# Altium footprint library Connector.PcbLib: 230 footprints (part 1 of 15)
Each footprint in its own frame and in the unit in brackets; x right, y up, seen from the top. Pads: shape width x height; smd on the part's side, far side on the other; paste and mask are expansions set on the pad; w line width, h text height; cw(c..) or ccw(c..) is an arc to the next point about the centre after c.
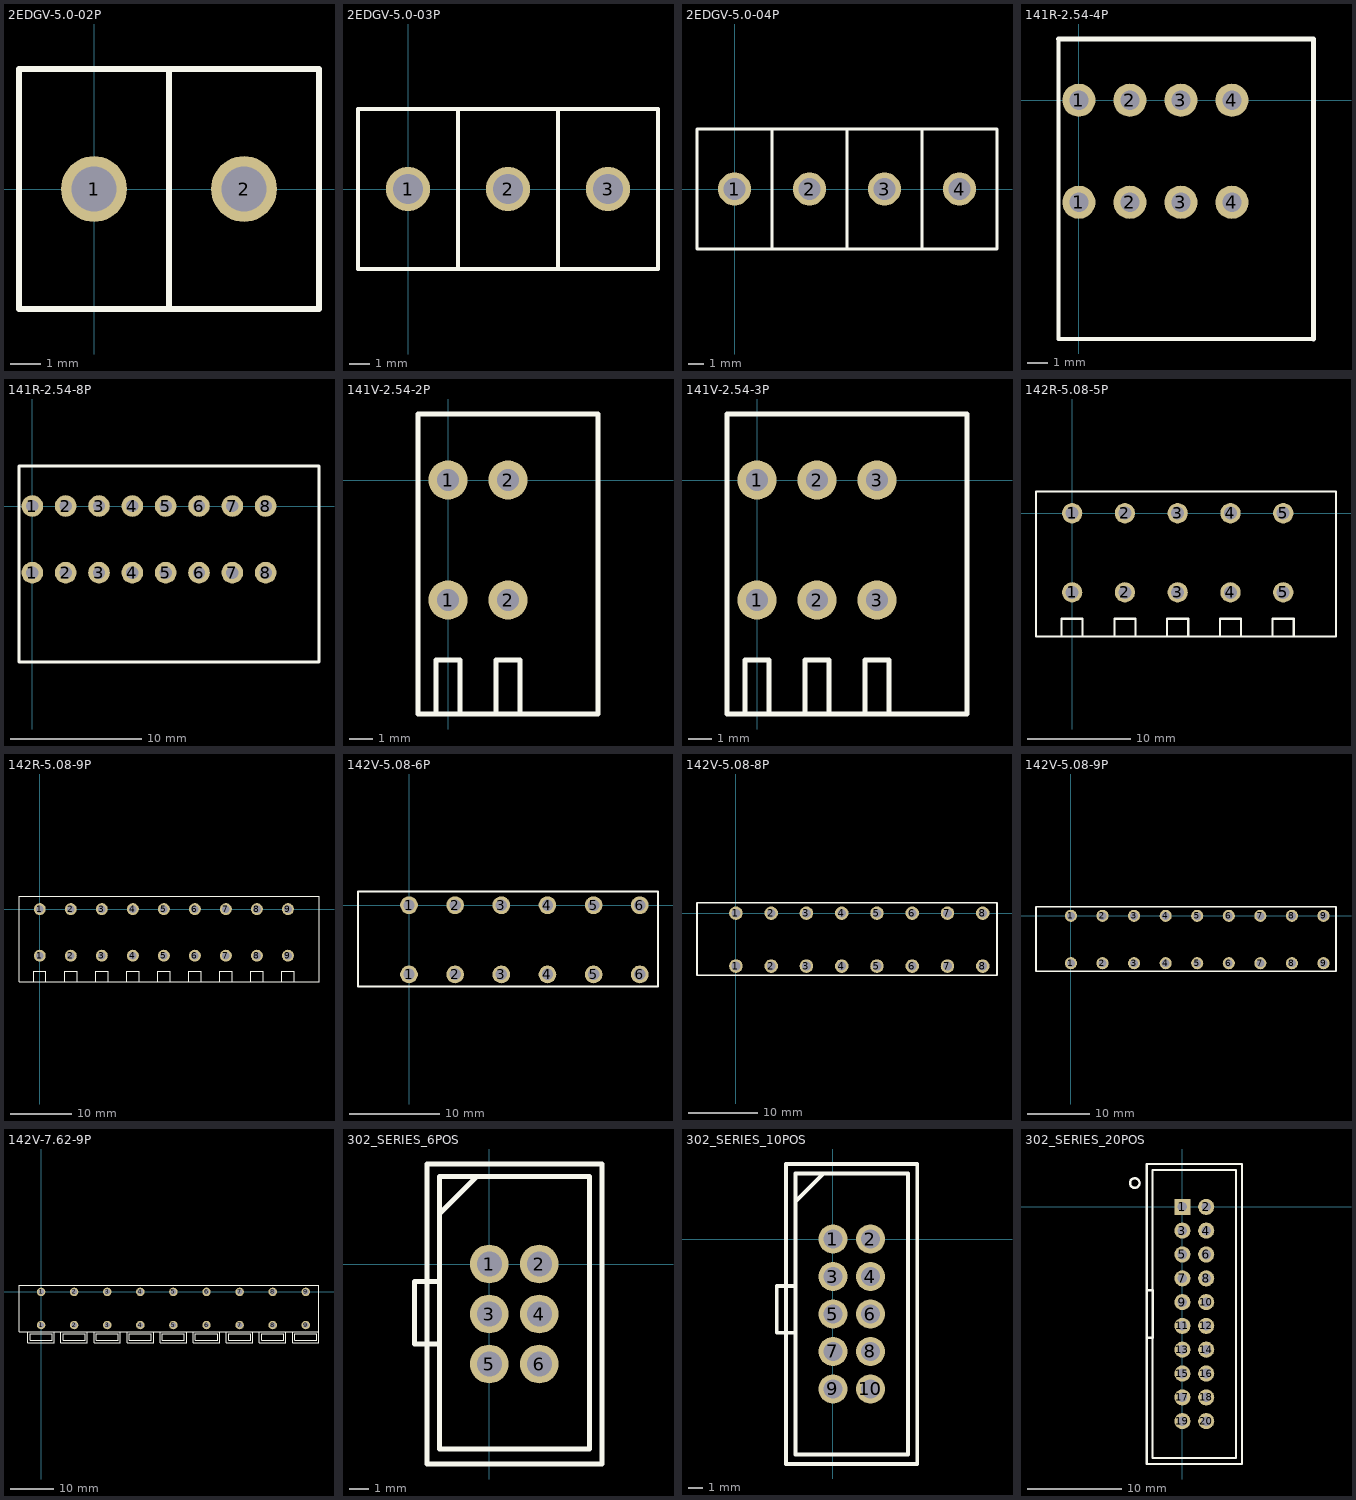
[diagram p0: the footprints below, top view; thin cyan lines are the x and y axes]

## 2EDGV-5.0-02P [mm]
pads (2):
  round 2.2 hole 1.5: 1(0,0) 2(5,0)
Top Overlay:
  lines w0.2: 2.5,-4 2.5,4 ; -2.5,-4 7.5,-4 7.5,4 -2.5,4 -2.5,0 -2.5,-4
3D body: height 12, standoff 0, extent 4.572,-0.508 5.5,0.508
3D body: height 12, standoff 0, extent -0.508,-0.508 0.508,0.508
3D body: height 12, standoff 0, extent -2.54,-4 7.46,-3.302
3D body: height 12, standoff 0, extent -2.5,3.302 7.5,4
3D body: height 2, standoff 0, extent -2.5,-4 7.5,4

## 2EDGV-5.0-03P [mm]
pads (3):
  round 2.2 hole 1.5: 1(0,0) 2(5,0) 3(10,0)
Top Overlay:
  lines w0.2: 2.5,-4 2.5,4 ; 7.5,-4 12.5,-4 12.5,4 7.5,4 ; 7.5,-4 -2.5,-4 -2.5,0 -2.5,4 7.5,4 ; 7.5,-4 7.5,4
3D body: height 12, standoff 0, extent 7.5,-4 12.5,4
3D body: height 12, standoff 0, extent -2.5,-4 7.5,4

## 2EDGV-5.0-04P [mm]
pads (4):
  round 2.2 hole 1.5: 1(0,0) 2(5,0) 3(10,0) 4(15,0)
Top Overlay:
  lines w0.2: 2.5,-4 2.5,4 ; 12.5,-4 12.5,4 ; 7.5,-4 7.5,4 ; 7.5,-4 -2.5,-4 -2.5,0 -2.5,4 7.5,4 ; 7.5,-4 17.5,-4 17.5,4 7.5,4
3D body: height 12, standoff 0, extent -2.5,-4 7.5,4
3D body: height 12, standoff 0, extent 7.5,-4 17.5,4

## 141R-2.54-4P [mm] "TERM BLOCK 8POS 90DEG 2.54MM PCB"
height 14.1
pads (8):
  round 1.65 hole 0.95: 1(0,-5.08) 1(0,0) 2(2.54,-5.08) 2(2.54,0) 3(5.08,-5.08) 3(5.08,0) 4(7.62,-5.08) 4(7.62,0)
Top Overlay:
  lines w0.2: -1.016,-10.16 -1.016,-11.887 ; 11.684,-11.887 -1.016,-11.887 ; 11.684,3.048 0.94,3.048 -1.016,3.048 -1.016,1.233 -1.016,-7.818 -1.016,-11.887
  lines w0.254: -1.016,3.048 11.684,3.048 11.684,-11.887

## 141R-2.54-8P [mm] "TERM BLOCK 8POS 90DEG 2.54MM PCB"
height 14.1
pads (16):
  round 1.65 hole 0.95: 1(0,-5.08) 1(0,0) 2(2.54,-5.08) 2(2.54,0) 3(5.08,-5.08) 3(5.08,0) 4(7.62,-5.08) 4(7.62,0) 5(10.16,-5.08) 5(10.16,0) 6(12.7,-5.08) 6(12.7,0) 7(15.24,-5.08) 7(15.24,0) 8(17.78,-5.08) 8(17.78,0)
Top Overlay:
  lines w0.2: -1.016,-10.16 -1.016,-11.887 ; 21.844,-11.887 -1.016,-11.887 ; 21.844,3.048 0.94,3.048 -1.016,3.048 -1.016,1.233 -1.016,-7.818 -1.016,-11.887
  lines w0.254: -1.016,3.048 21.844,3.048 21.844,-11.887

## 141V-2.54-2P [mm]
height 13.6
pads (4):
  round 1.65 hole 0.95: 1(0,-5.08) 1(0,0) 2(2.54,-5.08) 2(2.54,0)
Top Overlay:
  lines w0.2: -0.508,-9.906 -0.508,-7.62 0.508,-7.62 0.508,-9.906 ; 2.032,-9.906 2.032,-7.62 3.048,-7.62 3.048,-9.906 ; -1.27,-9.906 -1.27,-1.307 -1.27,2.794 6.35,2.794 6.35,-9.906 -1.27,-9.906
3D body: height 13.6, standoff 0, extent -1.27,-8.89 6.35,2.794
3D body: height 13.6, standoff 6, extent -0.508,-9.906 0.508,-7.62
3D body: height 13.6, standoff 6, extent 2.032,-9.906 3.048,-7.62

## 141V-2.54-3P [mm]
height 13.6
pads (6):
  round 1.65 hole 0.95: 1(0,-5.08) 1(0,0) 2(2.54,-5.08) 2(2.54,0) 3(5.08,-5.08) 3(5.08,0)
Top Overlay:
  lines w0.2: -0.508,-9.906 -0.508,-7.62 0.508,-7.62 0.508,-9.906 ; 2.032,-9.906 2.032,-7.62 3.048,-7.62 3.048,-9.906 ; 4.572,-9.906 4.572,-7.62 5.588,-7.62 5.588,-9.906 ; -1.27,-9.906 -1.27,-1.307 -1.27,2.794 8.89,2.794 8.89,-9.906 -1.27,-9.906
3D body: height 13.6, standoff 0, extent -1.27,-8.382 8.89,2.794
3D body: height 13.6, standoff 6, extent -0.508,-9.906 0.508,-7.62
3D body: height 13.6, standoff 6, extent 2.032,-9.906 3.048,-7.62
3D body: height 13.6, standoff 6, extent 4.572,-9.906 5.588,-7.62

## 142R-5.08-5P [mm] "TERM BLOCK 5POS 90DEG 5.08MM PCB"
height 14.1
pads (10):
  round 1.95 hole 1.25: 1(0,-7.62) 1(0,0) 2(5.08,-7.62) 2(5.08,0) 3(10.16,-7.62) 3(10.16,0) 4(15.24,-7.62) 4(15.24,0) 5(20.32,-7.62) 5(20.32,0)
Top Overlay:
  lines w0.2: -1.016,-11.887 -1.016,-10.16 1.016,-10.16 1.016,-11.887 ; 4.064,-11.887 4.064,-10.16 6.096,-10.16 6.096,-11.887 ; 9.144,-11.887 9.144,-10.16 11.176,-10.16 11.176,-11.887 ; 14.224,-11.887 14.224,-10.16 16.256,-10.16 16.256,-11.887 ; 19.304,-11.887 19.304,-10.16 21.336,-10.16 21.336,-11.887 ; 25.4,-9.144 25.4,1.524 25.4,2.108 ; 25.4,2.108 -3.48,2.108 -3.48,1.524 -3.48,-7.62 -3.48,-9.144 -3.48,-11.887 21.92,-11.887 25.4,-11.887 25.4,2.108

## 142R-5.08-9P [mm] "TERM BLOCK 9POS 90DEG 5.08MM PCB"
height 14.1
pads (18):
  round 1.95 hole 1.25: 1(0,-7.62) 1(0,0) 2(5.08,-7.62) 2(5.08,0) 3(10.16,-7.62) 3(10.16,0) 4(15.24,-7.62) 4(15.24,0) 5(20.32,-7.62) 5(20.32,0) 6(25.4,-7.62) 6(25.4,0) 7(30.48,-7.62) 7(30.48,0) 8(35.56,-7.62) 8(35.56,0) 9(40.64,-7.62) 9(40.64,0)
Top Overlay:
  lines w0.2: -1.016,-11.887 -1.016,-10.16 1.016,-10.16 1.016,-11.887 ; 4.064,-11.887 4.064,-10.16 6.096,-10.16 6.096,-11.887 ; 9.144,-11.887 9.144,-10.16 11.176,-10.16 11.176,-11.887 ; 14.224,-11.887 14.224,-10.16 16.256,-10.16 16.256,-11.887 ; 19.304,-11.887 19.304,-10.16 21.336,-10.16 21.336,-11.887 ; 19.64,0 20.32,-0.68 ; 24.384,-11.887 24.384,-10.16 26.416,-10.16 26.416,-11.887 ; 29.464,-11.887 29.464,-10.16 31.496,-10.16 31.496,-11.887 ; 34.544,-11.887 34.544,-10.16 36.576,-10.16 36.576,-11.887 ; 39.624,-11.887 39.624,-10.16 41.656,-10.16 41.656,-11.887 ; 45.72,-9.144 45.72,1.524 45.72,2.108 ; 45.72,2.108 45.72,-11.887 42.24,-11.887 -3.404,-11.887 -3.404,-9.144 -3.404,-7.62 -3.404,1.524 -3.404,2.108 -3.378,2.108 0,2.108 45.72,2.108

## 142V-5.08-6P [mm] "TERM BLOCK 6POS VERTICAL 5.08MM PCB"
height 14.1
pads (12):
  round 1.95 hole 1.25: 1(0,-7.62) 1(0,0) 2(5.08,-7.62) 2(5.08,0) 3(10.16,-7.62) 3(10.16,0) 4(15.24,-7.62) 4(15.24,0) 5(20.32,-7.62) 5(20.32,0) 6(25.4,-7.62) 6(25.4,0)
Top Overlay:
  lines w0.254: -5.613,-8.941 27.407,-8.941 27.407,1.473 27.381,1.499 -5.613,1.499 -5.613,-8.941
3D body: height 14.1, standoff 0, extent -5.588,-8.941 27.407,1.499
3D body: height 9, standoff 2, extent -2.54,-11.938 -1.524,-8.89
3D body: height 14.1, standoff 8, extent -2.54,-11.938 2.032,-8.89
3D body: height 14.2, standoff 14.1, extent -1.494,-7.847 1.494,-4.853
3D body: height 9, standoff 2, extent 2.54,-11.938 3.556,-8.89
3D body: height 14.1, standoff 8, extent 2.54,-11.938 7.112,-8.89
3D body: height 14.2, standoff 14.1, extent 3.586,-7.847 6.574,-4.853
3D body: height 9, standoff 2, extent 7.62,-11.938 8.636,-8.89
3D body: height 14.1, standoff 8, extent 7.62,-11.938 12.192,-8.89
3D body: height 14.2, standoff 14.1, extent 8.666,-7.847 11.654,-4.853
3D body: height 9, standoff 2, extent 12.7,-11.938 13.716,-8.89
3D body: height 14.1, standoff 8, extent 12.7,-11.938 17.272,-8.89
3D body: height 14.2, standoff 14.1, extent 13.746,-7.847 16.734,-4.853
3D body: height 9, standoff 2, extent 17.78,-11.938 18.796,-8.89
3D body: height 14.1, standoff 8, extent 17.78,-11.938 22.352,-8.89
3D body: height 14.2, standoff 14.1, extent 18.826,-7.847 21.814,-4.853
3D body: height 9, standoff 2, extent 22.86,-11.938 23.876,-8.89
3D body: height 14.1, standoff 8, extent 22.86,-11.938 27.432,-8.89
3D body: height 14.2, standoff 14.1, extent 23.906,-7.847 26.894,-4.853

## 142V-5.08-8P [mm] "TERM BLOCK 8POS VERTICAL 5.08MM PCB"
height 14.1
pads (16):
  round 1.95 hole 1.25: 1(0,-7.62) 1(0,0) 2(5.08,-7.62) 2(5.08,0) 3(10.16,-7.62) 3(10.16,0) 4(15.24,-7.62) 4(15.24,0) 5(20.32,-7.62) 5(20.32,0) 6(25.4,-7.62) 6(25.4,0) 7(30.48,-7.62) 7(30.48,0) 8(35.56,-7.62) 8(35.56,0)
Top Overlay:
  lines w0.254: -5.613,-8.941 -5.613,1.499 37.617,1.499 37.617,-3.505 37.617,-8.941 -5.613,-8.941
3D body: height 14.2, standoff 14.1, extent 23.906,-7.847 26.894,-4.853
3D body: height 14.1, standoff 8, extent 22.86,-11.938 27.432,-8.89
3D body: height 9, standoff 2, extent 22.86,-11.938 23.876,-8.89
3D body: height 14.2, standoff 14.1, extent 18.826,-7.847 21.814,-4.853
3D body: height 14.1, standoff 8, extent 17.78,-11.938 22.352,-8.89
3D body: height 9, standoff 2, extent 17.78,-11.938 18.796,-8.89
3D body: height 14.2, standoff 14.1, extent 13.746,-7.847 16.734,-4.853
3D body: height 14.1, standoff 8, extent 12.7,-11.938 17.272,-8.89
3D body: height 9, standoff 2, extent 12.7,-11.938 13.716,-8.89
3D body: height 14.2, standoff 14.1, extent 8.666,-7.847 11.654,-4.853
3D body: height 14.1, standoff 8, extent 7.62,-11.938 12.192,-8.89
3D body: height 9, standoff 2, extent 7.62,-11.938 8.636,-8.89
3D body: height 14.2, standoff 14.1, extent 3.586,-7.847 6.574,-4.853
3D body: height 14.1, standoff 8, extent 2.54,-11.938 7.112,-8.89
3D body: height 9, standoff 2, extent 2.54,-11.938 3.556,-8.89
3D body: height 14.2, standoff 14.1, extent -1.494,-7.847 1.494,-4.853
3D body: height 14.1, standoff 8, extent -2.54,-11.938 2.032,-8.89
3D body: height 9, standoff 2, extent -2.54,-11.938 -1.524,-8.89
3D body: height 14.1, standoff 0, extent -5.588,-8.941 37.592,1.499
3D body: height 14.2, standoff 14.1, extent 28.986,-7.847 31.974,-4.853
3D body: height 14.1, standoff 8, extent 27.94,-11.938 32.512,-8.89
3D body: height 9, standoff 2, extent 27.94,-11.938 28.956,-8.89
3D body: height 14.2, standoff 14.1, extent 34.066,-7.847 37.054,-4.853
3D body: height 14.1, standoff 8, extent 33.02,-11.938 37.592,-8.89
3D body: height 9, standoff 2, extent 33.02,-11.938 34.036,-8.89

## 142V-5.08-9P [mm] "TERM BLOCK 9POS VERTICAL 5.08MM PCB"
height 14.1
pads (18):
  round 1.95 hole 1.25: 1(0,-7.62) 1(0,0) 2(5.08,-7.62) 2(5.08,0) 3(10.16,-7.62) 3(10.16,0) 4(15.24,-7.62) 4(15.24,0) 5(20.32,-7.62) 5(20.32,0) 6(25.4,-7.62) 6(25.4,0) 7(30.48,-7.62) 7(30.48,0) 8(35.56,-7.62) 8(35.56,0) 9(40.64,-7.62) 9(40.64,0)
Top Overlay:
  lines w0.254: 42.621,1.499 42.647,1.473 42.647,-8.941 -5.613,-8.941 -5.613,1.499 42.647,1.499
3D body: height 9, standoff 2, extent 38.1,-11.938 39.116,-8.89
3D body: height 14.1, standoff 8, extent 38.1,-11.938 42.672,-8.89
3D body: height 14.2, standoff 14.1, extent 39.146,-7.847 42.134,-4.853
3D body: height 9, standoff 2, extent 33.02,-11.938 34.036,-8.89
3D body: height 14.1, standoff 8, extent 33.02,-11.938 37.592,-8.89
3D body: height 14.2, standoff 14.1, extent 34.066,-7.847 37.054,-4.853
3D body: height 9, standoff 2, extent 27.94,-11.938 28.956,-8.89
3D body: height 14.1, standoff 8, extent 27.94,-11.938 32.512,-8.89
3D body: height 14.2, standoff 14.1, extent 28.986,-7.847 31.974,-4.853
3D body: height 14.1, standoff 0, extent -5.588,-8.941 42.672,1.499
3D body: height 9, standoff 2, extent -2.54,-11.938 -1.524,-8.89
3D body: height 14.1, standoff 8, extent -2.54,-11.938 2.032,-8.89
3D body: height 14.2, standoff 14.1, extent -1.494,-7.847 1.494,-4.853
3D body: height 9, standoff 2, extent 2.54,-11.938 3.556,-8.89
3D body: height 14.1, standoff 8, extent 2.54,-11.938 7.112,-8.89
3D body: height 14.2, standoff 14.1, extent 3.586,-7.847 6.574,-4.853
3D body: height 9, standoff 2, extent 7.62,-11.938 8.636,-8.89
3D body: height 14.1, standoff 8, extent 7.62,-11.938 12.192,-8.89
3D body: height 14.2, standoff 14.1, extent 8.666,-7.847 11.654,-4.853
3D body: height 9, standoff 2, extent 12.7,-11.938 13.716,-8.89
3D body: height 14.1, standoff 8, extent 12.7,-11.938 17.272,-8.89
3D body: height 14.2, standoff 14.1, extent 13.746,-7.847 16.734,-4.853
3D body: height 9, standoff 2, extent 17.78,-11.938 18.796,-8.89
3D body: height 14.1, standoff 8, extent 17.78,-11.938 22.352,-8.89
3D body: height 14.2, standoff 14.1, extent 18.826,-7.847 21.814,-4.853
3D body: height 9, standoff 2, extent 22.86,-11.938 23.876,-8.89
3D body: height 14.1, standoff 8, extent 22.86,-11.938 27.432,-8.89
3D body: height 14.2, standoff 14.1, extent 23.906,-7.847 26.894,-4.853

## 142V-7.62-9P [mm] "TERM BLOCK 9POS 90DEG 7.62MM PCB"
height 14.1
pads (18):
  round 1.95 hole 1.25: 1(0,-7.62) 1(0,0) 2(7.62,-7.62) 2(7.62,0) 3(15.24,-7.62) 3(15.24,0) 4(22.86,-7.62) 4(22.86,0) 5(30.48,-7.62) 5(30.48,0) 6(38.1,-7.62) 6(38.1,0) 7(45.72,-7.62) 7(45.72,0) 8(53.34,-7.62) 8(53.34,0) 9(60.96,-7.62) 9(60.96,0)
Top Overlay:
  lines w0.2: -2.54,1.524 63.5,1.524 ; 3.048,-9.144 3.048,-11.684 -3.048,-11.684 -3.048,-9.144 ; 4.572,-9.144 4.572,-11.684 10.668,-11.684 10.668,-9.144 ; 12.192,-9.144 12.192,-11.684 18.288,-11.684 18.288,-9.144 ; 19.812,-9.144 19.812,-11.684 25.908,-11.684 25.908,-9.144 ; 27.432,-9.144 27.432,-11.684 33.528,-11.684 33.528,-9.144 ; 29.8,-7.62 30.48,-8.3 ; 29.8,0 30.48,-0.68 ; 35.052,-9.144 35.052,-11.684 41.148,-11.684 41.148,-9.144 ; 42.672,-9.144 42.672,-11.684 48.768,-11.684 48.768,-9.144 ; 50.292,-9.144 50.292,-11.684 56.388,-11.684 56.388,-9.144 ; 57.912,-9.144 57.912,-11.684 64.008,-11.684 64.008,-9.144 ; -3.048,-9.144 64.008,-9.144 ; -3.048,-9.144 -5.08,-9.144 -5.08,1.524 64.008,1.524 64.008,-9.144 ; -2.54,-11.176 2.54,-11.176 2.54,-9.652 -2.54,-9.652 -2.54,-11.176 ; 5.08,-11.176 5.08,-9.652 10.16,-9.652 10.16,-11.176 5.08,-11.176 ; 12.7,-11.176 12.7,-9.652 17.78,-9.652 17.78,-11.176 12.7,-11.176 ; 20.32,-11.176 20.32,-9.652 25.4,-9.652 25.4,-11.176 20.32,-11.176 ; 27.94,-11.176 27.94,-9.652 33.02,-9.652 33.02,-11.176 27.94,-11.176 ; 35.56,-11.176 35.56,-9.652 40.64,-9.652 40.64,-11.176 35.56,-11.176 ; 43.18,-11.176 43.18,-9.652 48.26,-9.652 48.26,-11.176 43.18,-11.176 ; 50.8,-11.176 50.8,-9.652 55.88,-9.652 55.88,-11.176 50.8,-11.176 ; 58.42,-11.176 58.42,-9.652 63.5,-9.652 63.5,-11.176 58.42,-11.176

## 302_SERIES_6POS [mm] "2.54MM DUAL ROW VERTICAL BOX HEADER"
pads (6):
  round 1.97 hole 1.27: 1(0,0) 2(2.54,0) 3(0,-2.54) 4(2.54,-2.54) 5(0,-5.08) 6(2.54,-5.08)
Top Overlay:
  lines w0.254: -2.54,-4.064 -3.175,-4.064 -3.81,-4.064 -3.81,-0.889 -3.175,-0.889 -2.54,-0.889 ; -2.54,2.54 -0.635,4.445 ; -3.175,-10.16 5.715,-10.16 5.715,5.08 -3.175,5.08 -3.175,-10.16 ; -2.54,-9.398 5.08,-9.398 5.08,4.445 -2.54,4.445 -2.54,-3.81 -2.54,-9.398

## 302_SERIES_10POS [mm] "2.54MM DUAL ROW VERTICAL BOX HEADER"
pads (10):
  round 1.97 hole 1.27: 1(0,0) 2(2.54,0) 3(0,-2.54) 4(2.54,-2.54) 5(0,-5.08) 6(2.54,-5.08) 7(0,-7.62) 8(2.54,-7.62) 9(0,-10.16) 10(2.54,-10.16)
Top Overlay:
  lines w0.254: -2.54,-6.35 -3.175,-6.35 -3.81,-6.35 -3.81,-3.175 -3.175,-3.175 -2.54,-3.175 ; -2.54,2.54 -0.635,4.445 ; -3.175,-15.24 -3.175,5.08 5.715,5.08 5.715,-15.24 -3.175,-15.24 ; -2.54,-14.605 -2.54,-3.81 -2.54,4.445 5.08,4.445 5.08,-14.605 -2.54,-14.605

## 302_SERIES_20POS [mm]
pads (20):
  rect 1.72x1.72 hole 1.02: 1(0,0)
  round 1.72 hole 1.02: 2(2.54,0) 3(0,-2.54) 4(2.54,-2.54) 5(0,-5.08) 6(2.54,-5.08) 7(0,-7.62) 8(2.54,-7.62) 9(0,-10.16) 10(2.54,-10.16) 11(0,-12.7) 12(2.54,-12.7) 13(0,-15.24) 14(2.54,-15.24) 15(0,-17.78) 16(2.54,-17.78) 17(0,-20.32) 18(2.54,-20.32) 19(0,-22.86) 20(2.54,-22.86)
Top Overlay:
  circle w0.254: c-5.08,2.54 r0.508
  lines w0.2: -3.175,-26.797 5.715,-26.797 5.715,3.937 -3.175,3.937 -3.175,-26.797
  lines w0.254: -3.81,-13.97 -3.175,-13.97 -3.175,-8.89 -3.81,-8.89 ; -3.81,-27.432 -3.81,4.572 6.35,4.572 6.35,-27.432 -3.81,-27.432